# Altium footprint library PcbLib1.PcbLib: 42 footprints (part 1 of 3)
Each footprint in its own frame and in the unit in brackets; x right, y up, seen from the top. Pads: shape width x height; smd on the part's side, far side on the other; paste and mask are expansions set on the pad; w line width, h text height; cw(c..) or ccw(c..) is an arc to the next point about the centre after c.
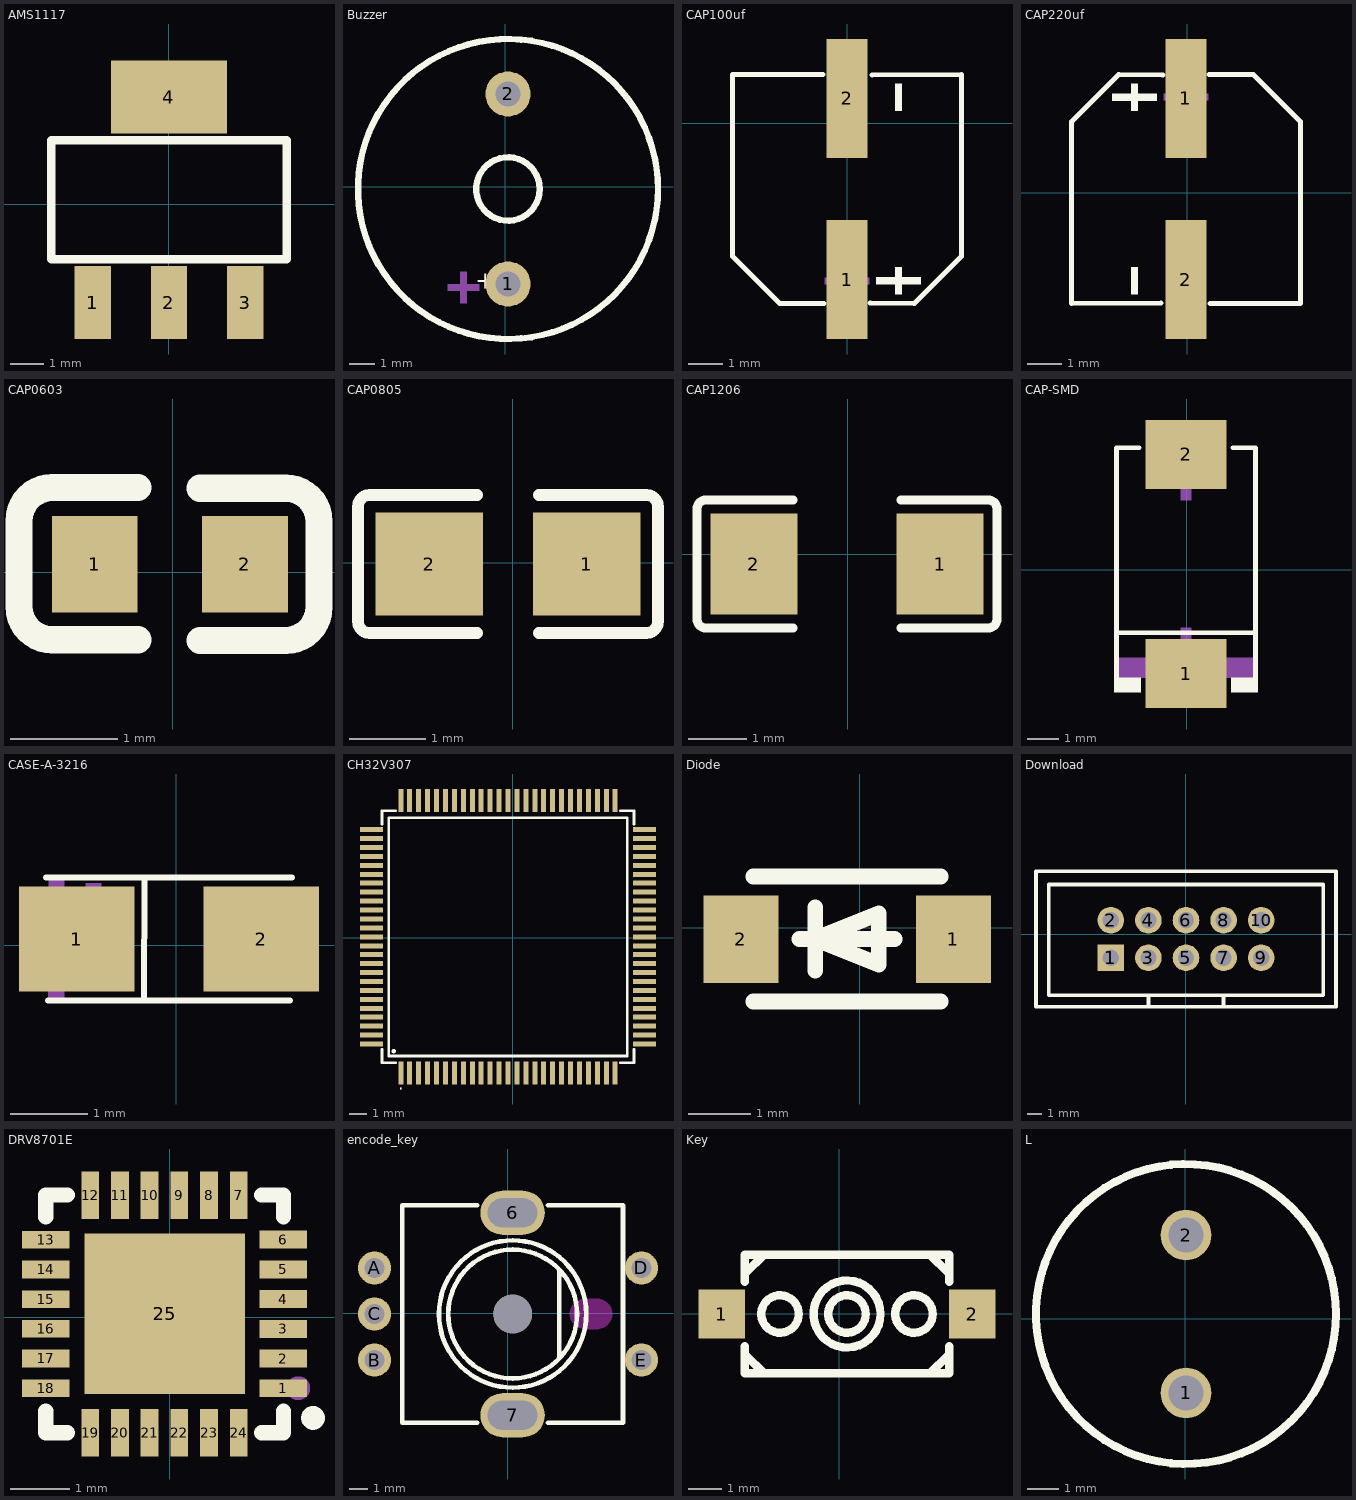
[diagram p0: the footprints below, top view; thin cyan lines are the x and y axes]

## AMS1117 [mm]
pads (4):
  rect 1.1x2.2 smd: 1(-2.297,-2.959) 2(0.003,-2.959) 3(2.303,-2.959)
  rect 3.5x2.2 smd: 4(0.003,3.238)
Top Overlay:
  lines w0.254: -3.547,-1.66 3.553,-1.66 3.553,1.94 -3.547,1.94 -3.547,-1.66
Mechanical 15:
  circle w0.254: c-2.283,-3.543 r0.127
3D body "AMS1117.step": height 1.75, standoff 0, extent -3.217,-3.433 3.283,3.677

## Buzzer [mm]
pads (2):
  round 1.8 hole 1: 1(0.102,-3.897) 2(0.102,3.703)
Top Overlay:
  circle w0.254: c0.102,-0.098 r1.27
  circle w0.254: c0.102,-0.098 r6
  text "+" at -1.215,-4.093 h0.71
Mechanical 15:
  region: -1.803,-4.542 -1.803,-3.399 -1.549,-3.399 -1.549,-4.669 -1.803,-4.669
  region: -1.168,-4.161 -2.311,-4.161 -2.311,-3.907 -1.041,-3.907 -1.041,-4.161
3D body "BUZZER1.step": height 9.51, standoff -4.5, extent -6.127,-5.893 5.873,6.107
3D body: height 0.25, standoff 0, extent -6.096,-5.334 -6.096,-5.334

## CAP100uf [mm]
pads (2):
  rect 1.2x3.5 smd: 1(-0.008,-4.608) 2(-0.008,0.732)
Top Overlay:
  region: 1.411,1.164 1.609,1.164 1.609,0.372 1.411,0.372
  region: 1.411,-5.04 1.609,-5.04 1.609,-4.248 1.411,-4.248
  region: 0.85,-4.743 2.17,-4.743 2.17,-4.545 0.85,-4.545
  lines w0.152: -0.715,1.432 -3.384,1.439 -3.384,-3.918 -1.988,-5.314 -0.693,-5.314 ; 0.678,-5.3 1.974,-5.313 3.368,-3.919 3.368,1.438 0.732,1.418
Mechanical 15:
  region: -0.107,1.164 0.091,1.164 0.091,0.372 -0.107,0.372
  region: -0.107,-5.04 0.091,-5.04 0.091,-4.248 -0.107,-4.248
  region: -0.668,-4.748 0.652,-4.748 0.652,-4.55 -0.668,-4.55
3D body "110uf.step": height 7.75, standoff 0, extent -3.295,-5.875 3.306,1.925

## CAP220uf [mm]
pads (2):
  rect 1.2x3.5 smd: 1(-0.033,2.779) 2(-0.033,-2.561)
Top Overlay:
  region: -1.452,-2.993 -1.65,-2.993 -1.65,-2.201 -1.452,-2.201
  region: -1.452,3.211 -1.65,3.211 -1.65,2.419 -1.452,2.419
  region: -0.891,2.914 -2.211,2.914 -2.211,2.716 -0.891,2.716
  lines w0.152: -0.772,-3.247 -3.409,-3.267 -3.409,2.09 -2.014,3.485 -0.719,3.471 ; 0.653,3.485 1.947,3.485 3.343,2.089 3.343,-3.267 0.675,-3.26
Mechanical 15:
  region: 0.066,-2.993 -0.132,-2.993 -0.132,-2.201 0.066,-2.201
  region: 0.066,3.211 -0.132,3.211 -0.132,2.419 0.066,2.419
  region: 0.627,2.919 -0.693,2.919 -0.693,2.721 0.627,2.721
3D body "220uf.step": height 7.75, standoff 0, extent -3.371,-3.704 3.23,4.096

## CAP0603 [mm]
pads (2):
  rect 0.8x0.9 smd: 1(-0.725,0.076) 2(0.675,0.076)
Top Overlay:
  lines w0.254: -0.321,-0.628 -1.121,-0.628 cw(c-1.121,-0.318) -1.431,-0.318 -1.431,0.482 cw(c-1.121,0.482) -1.121,0.792 -0.321,0.792 ; 0.255,-0.634 1.055,-0.634 ccw(c1.055,-0.324) 1.365,-0.324 ; 0.255,0.786 1.055,0.786 cw(c1.055,0.476) 1.365,0.476 ; 1.365,-0.324 1.365,0.476
3D body "C3.step": height 0.8, standoff 0, extent -0.927,-0.324 0.673,0.476

## CAP0805 [mm]
pads (2):
  rect 1.41x1.35 smd: 1(0.965,-0.015) 2(-1.095,-0.015)
Top Overlay:
  lines w0.152: -2.028,-0.766 ccw(c-1.876,-0.766) -1.876,-0.919 ; -2.028,-0.766 -2.028,0.736 cw(c-1.876,0.736) -1.876,0.888 -0.466,0.888 ; -1.876,-0.919 -0.466,-0.919 ; 0.336,-0.919 1.746,-0.919 ; 0.336,0.888 1.746,0.888 cw(c1.746,0.736) 1.899,0.736 1.899,-0.766 ; 1.746,-0.919 ccw(c1.746,-0.766) 1.899,-0.766
Top Paste:
  region: -0.54,0.605 -0.54,0.185 -0.985,0.185 -0.985,-0.265 -0.545,-0.265 -0.54,-0.675 -0.59,-0.725 -1.74,-0.725 -1.79,-0.675 -1.79,0.605 -1.74,0.655 -0.59,0.655
  region: 1.61,0.605 1.61,-0.675 1.56,-0.725 0.41,-0.725 0.36,-0.675 0.355,-0.265 0.805,-0.265 0.805,0.185 0.365,0.185 0.36,0.605 0.41,0.655 1.56,0.655
3D body "CAP0805.step": height 1.3, standoff 0, extent -1.145,-0.685 0.855,0.615

## CAP1206 [mm]
pads (2):
  rect 1.485x1.728 smd: 1(1.583,-0.168) 2(-1.602,-0.168)
Top Overlay:
  lines w0.152: -0.936,-1.26 -2.421,-1.26 cw(c-2.421,-1.108) -2.574,-1.108 -2.574,0.773 cw(c-2.421,0.773) -2.421,0.925 -0.936,0.925 ; 0.916,-1.26 2.401,-1.26 ccw(c2.401,-1.108) 2.554,-1.108 2.554,0.773 ccw(c2.401,0.773) 2.401,0.925 0.916,0.925
Top Paste:
  region: -0.86,0.596 -0.86,0.226 -0.96,0.126 -1.265,0.126 -1.365,0.026 -1.365,-0.361 -1.265,-0.461 -0.96,-0.461 -0.86,-0.561 -0.86,-0.932 -0.96,-1.032 -2.245,-1.032 -2.345,-0.932 -2.345,0.596 -2.245,0.696 -0.96,0.696
  region: 0.84,0.596 0.84,0.226 0.94,0.126 1.245,0.126 1.345,0.026 1.345,-0.361 1.245,-0.461 0.94,-0.461 0.84,-0.561 0.84,-0.932 0.94,-1.032 2.225,-1.032 2.325,-0.932 2.325,0.596 2.225,0.696 0.94,0.696
3D body "CAP1206.step": height 1.3, standoff 0, extent -1.679,-0.96 1.521,0.64

## CAP-SMD [mil]
pads (2):
  rect 102.05x86.91 smd: 1(-1.2,-130.94) 2(-1.2,145.54)
Top Overlay:
  region: 89.45,-136.4 55.82,-136.4 55.82,-154.4 89.45,-154.4
  region: -91.85,-136.4 -58.22,-136.4 -58.22,-154.4 -91.85,-154.4
  lines w6: -88.85,-139.4 -88.85,154 -60.22,154 ; -88.85,-79.48 86.45,-79.48 ; 57.82,154 86.45,154 86.45,-139.4
Mechanical 15:
  region: -7.55,138.3 5.15,138.3 5.15,87.52 -7.55,87.52
  region: -7.55,-123.7 5.15,-123.7 5.15,-72.92 -7.55,-72.92
  region: -43.52,-104.66 41.12,-104.66 41.12,-91.96 -43.52,-91.96
  region: -85.85,-136.4 -43.52,-136.4 -43.52,-111.01 -85.85,-111.01
  region: 83.45,-136.4 41.12,-136.4 41.12,-111.01 83.45,-111.01
3D body "CAP_SMD.step": height 167.47, standoff 0, extent -85.74,-139.9 83.55,147.49

## CASE-A-3216 [mil]
pads (2):
  rect 59.05x53.5 smd: 1(-51.07,3.1) 2(43.42,3.1)
Top Overlay:
  lines w3.15: -66.83,34.6 59.17,34.6 ; -65.83,-28.4 58.17,-28.4 ; -16.56,-28.4 -16.41,34.6
Mechanical 15:
  region: 55.25,8.23 55.25,-0.03 22.18,-0.03 22.18,8.23
  region: -65.38,35.1 -57.38,35.1 -57.38,22.1 -65.38,22.1
  region: -57.5,-28.9 -65.5,-28.9 -65.5,-15.9 -57.5,-15.9
  region: -27.84,8.23 -27.84,-0.03 -60.91,-0.03 -60.91,8.23
  region: -46.38,31.6 -38.38,31.6 -38.38,-23.4 -46.38,-23.4
3D body "CASE-A-3216.step": height 66.93, standoff 0, extent -67.29,-30.49 58.7,32.5

## CH32V307 [mm] "TSQFP, 100-Leads, Body 14.00x14.00mm, Pitch 0.50mm, IPC Medium Density"
height 1.5
pads (100):
  rect 0.28x1.287 smd: 1(-6.263,-7.574) 2(-5.763,-7.574) 3(-5.263,-7.574) 4(-4.763,-7.574) 5(-4.263,-7.574) 6(-3.763,-7.574) 7(-3.263,-7.574) 8(-2.763,-7.574) 9(-2.263,-7.574) 10(-1.763,-7.574) 11(-1.263,-7.574) 12(-0.763,-7.574) 13(-0.263,-7.574) 14(0.237,-7.574) 15(0.737,-7.574) 16(1.237,-7.574) 17(1.737,-7.574) 18(2.237,-7.574) 19(2.737,-7.574) 20(3.237,-7.574) 21(3.737,-7.574) 22(4.237,-7.574) 23(4.737,-7.574) 24(5.237,-7.574) 25(5.737,-7.574) 51(5.737,7.683) 52(5.237,7.683) 53(4.737,7.683) 54(4.237,7.683) 55(3.737,7.683) 56(3.237,7.683) 57(2.737,7.683) 58(2.237,7.683) 59(1.737,7.683) 60(1.237,7.683) 61(0.737,7.683) 62(0.237,7.683) 63(-0.263,7.683) 64(-0.763,7.683) 65(-1.263,7.683) 66(-1.763,7.683) 67(-2.263,7.683) 68(-2.763,7.683) 69(-3.263,7.683) 70(-3.763,7.683) 71(-4.263,7.683) 72(-4.763,7.683) 73(-5.263,7.683) 74(-5.763,7.683) 75(-6.263,7.683)
  rect 1.287x0.28 smd: 26(7.365,-5.946) 27(7.365,-5.446) 28(7.365,-4.946) 29(7.365,-4.446) 30(7.365,-3.946) 31(7.365,-3.446) 32(7.365,-2.946) 33(7.365,-2.446) 34(7.365,-1.946) 35(7.365,-1.446) 36(7.365,-0.946) 37(7.365,-0.446) 38(7.365,0.054) 39(7.365,0.554) 40(7.365,1.054) 41(7.365,1.554) 42(7.365,2.054) 43(7.365,2.554) 44(7.365,3.054) 45(7.365,3.554) 46(7.365,4.054) 47(7.365,4.554) 48(7.365,5.054) 49(7.365,5.554) 50(7.365,6.054) 76(-7.892,6.054) 77(-7.892,5.554) 78(-7.892,5.054) 79(-7.892,4.554) 80(-7.892,4.054) 81(-7.892,3.554) 82(-7.892,3.054) 83(-7.892,2.554) 84(-7.892,2.054) 85(-7.892,1.554) 86(-7.892,1.054) 87(-7.892,0.554) 88(-7.892,0.054) 89(-7.892,-0.446) 90(-7.892,-0.946) 91(-7.892,-1.446) 92(-7.892,-1.946) 93(-7.892,-2.446) 94(-7.892,-2.946) 95(-7.892,-3.446) 96(-7.892,-3.946) 97(-7.892,-4.446) 98(-7.892,-4.946) 99(-7.892,-5.446) 100(-7.892,-5.946)
Top Overlay:
  circle w0.055: c-6.263,-8.433 r0.027
  circle w0.124: c-6.657,-6.34 r0.062
  lines w0.152: -7.314,-6.238 -7.314,-6.997 -6.556,-6.997 ; -7.314,6.347 -7.314,7.105 -6.556,7.105 ; 6.029,-6.997 6.788,-6.997 6.788,-6.238 ; 6.029,7.105 6.788,7.105 6.788,6.347 ; -6.933,-6.616 6.407,-6.616 6.407,6.724 -6.933,6.724 -6.933,-6.616
Mechanical 15:
  circle w0.055: c-6.263,-8.433 r0.027
3D body "TSQFP50P1600X1600X150-100N.step": height 1.5, standoff 0, extent -8.253,-7.953 7.747,8.047

## Diode [mm]
pads (2):
  rect 1.2x1.4 smd: 1(1.499,-0.177) 2(-1.901,-0.177)
Top Overlay:
  lines w0.254: -1.701,-1.177 1.299,-1.177 ; -1.701,0.823 1.299,0.823 ; -0.963,-0.177 0.561,-0.177 ; -0.709,-0.685 -0.709,0.331 ; -0.709,-0.177 0.307,-0.583 0.307,0.229 -0.709,-0.177
Mechanical 15:
  region: 1.964,-0.39 1.089,-0.39 1.089,-0.22 1.964,-0.22 1.964,-0.23
  region: 1.61,0.201 1.61,-0.674 1.441,-0.674 1.441,0.201 1.45,0.201
  region: -1.509,-0.318 -2.384,-0.318 -2.384,-0.149 -1.509,-0.149 -1.509,-0.158
3D body "D5.step": height 0.81, standoff -0.26, extent -1.952,-1.154 1.698,0.646

## Download [mm]
pads (10):
  rect 1.8x1.8 hole 1.1: 1(-5.08,-1.575)
  round 1.8 hole 1.1: 2(-5.08,0.965) 3(-2.54,-1.575) 4(-2.54,0.965) 5(0,-1.575) 6(0,0.965) 7(2.54,-1.575) 8(2.54,0.965) 9(5.08,-1.575) 10(5.08,0.965)
Top Overlay:
  lines w0.254: -10.14,-4.877 -10.14,4.267 10.14,4.267 10.14,-4.877 -10.14,-4.877 ; -9.271,-4.115 9.271,-4.115 9.271,3.378 -9.271,3.378 -9.271,-4.115 ; -2.54,-4.877 2.54,-4.877 2.54,-4.115 -2.54,-4.115 -2.54,-4.877
3D body "CN3.step": height 9.2, standoff -3.1, extent -9.832,-4.744 10.468,4.156

## DRV8701E [mm]
pads (25):
  rect 0.8x0.3 smd: 1(1.914,-1.193) 2(1.914,-0.694) 3(1.914,-0.194) 4(1.914,0.307) 5(1.914,0.807) 6(1.914,1.308) 13(-2.086,1.307) 14(-2.086,0.806) 15(-2.086,0.306) 16(-2.086,-0.194) 17(-2.086,-0.692) 18(-2.086,-1.193)
  rect 0.3x0.8 smd: 7(1.164,2.057) 8(0.664,2.057) 9(0.163,2.057) 10(-0.337,2.057) 11(-0.837,2.057) 12(-1.336,2.057) 19(-1.336,-1.944) 20(-0.836,-1.944) 21(-0.336,-1.944) 22(0.163,-1.944) 23(0.663,-1.944) 24(1.163,-1.944)
  rect 2.7x2.7 smd: 25(-0.084,0.058)
Top Overlay:
  circle w0.2: c2.414,-1.693 r0.1
  lines w0.254: -2.086,-1.574 -2.086,-1.943 -1.717,-1.943 ; -2.086,1.688 -2.086,2.057 -1.719,2.057 ; 1.544,-1.943 1.914,-1.943 1.914,-1.574 ; 1.545,2.057 1.914,2.057 1.914,1.689
Top Paste:
  region: 0.996,-1.022 -1.164,-1.022 -1.164,1.138 0.996,1.138
  region: -2.535,1.157 -1.636,1.157 -1.636,1.456 -2.535,1.456
  region: -2.535,0.656 -1.636,0.656 -1.636,0.956 -2.535,0.956
  region: -2.535,0.156 -1.636,0.156 -1.636,0.456 -2.535,0.456
  region: -2.535,-0.345 -1.636,-0.345 -1.636,-0.042 -2.535,-0.042
  region: -2.535,-0.842 -1.636,-0.842 -1.636,-0.543 -2.535,-0.543
  region: -2.535,-1.343 -1.636,-1.343 -1.636,-1.043 -2.535,-1.043
  region: -1.185,2.507 -1.487,2.507 -1.487,1.608 -1.185,1.608
  region: -1.186,-1.493 -1.486,-1.493 -1.486,-2.395 -1.186,-2.395
  region: -0.687,2.507 -0.987,2.507 -0.987,1.608 -0.687,1.608
  region: -0.686,-1.493 -0.985,-1.493 -0.985,-2.395 -0.686,-2.395
  region: -0.487,-2.395 -0.185,-2.395 -0.185,-1.493 -0.487,-1.493
  region: -0.187,2.507 -0.487,2.507 -0.487,1.608 -0.187,1.608
  region: 0.013,-2.395 0.313,-2.395 0.313,-1.493 0.013,-1.493
  region: 0.313,2.507 0.014,2.507 0.014,1.608 0.313,1.608
  region: 0.813,-1.493 0.513,-1.493 0.513,-2.395 0.813,-2.395
  region: 0.814,2.507 0.514,2.507 0.514,1.608 0.814,1.608
  region: 1.313,-1.493 1.014,-1.493 1.014,-2.395 1.313,-2.395
  region: 1.314,2.507 1.014,2.507 1.014,1.608 1.314,1.608
  region: 2.364,-1.043 1.464,-1.043 1.464,-1.343 2.364,-1.343
  region: 2.364,1.457 1.465,1.457 1.465,1.158 2.364,1.158
  region: 1.465,0.657 2.364,0.657 2.364,0.957 1.465,0.957
  region: 1.465,0.157 2.364,0.157 2.364,0.457 1.465,0.457
  region: 2.364,-0.544 1.465,-0.544 1.465,-0.844 2.364,-0.844
  region: 1.465,-0.344 2.364,-0.344 2.364,-0.044 1.465,-0.044
Mechanical 15:
  circle w0.2: c2.165,-1.193 r0.1
3D body "U7.step": height 1.02, standoff 0, extent -2.01,-2.073 2.01,1.947

## encode_key [mm] "编码器开关"
pads (8):
  oval 3.5x2.4 hole 1.6 slot 2.7 at 0 deg: 6(0.253,5.449) 7(0.253,-5.551)
  round 1.8 hole 1.1: A(-7.247,2.449) B(-7.247,-2.551) C(-7.247,-0.051) D(7.253,2.449) E(7.253,-2.551)
  round 2.1 hole 2.1 unplated: ""(0.253,-0.051)
Top Overlay:
  circle w0.254: c0.253,-0.051 r4
  circle w0.254: c0.253,-0.051 r3.5
  lines w0.254: -5.747,5.849 -5.747,-5.951 -1.671,-5.951 ; -5.677,5.849 -1.671,5.849 ; 2.177,-5.951 6.253,-5.951 6.253,5.849 2.177,5.849 ; 2.793,-2.371 2.793,2.359
Keep-Out Layer:
  board cut-out: 4.133,0.779 4.895,0.779 4.998,0.771 5.194,0.704 5.368,0.591 5.508,0.439 5.606,0.258 5.657,0.057 5.657,-0.15 5.606,-0.35 5.508,-0.532 5.368,-0.684 5.194,-0.797 4.998,-0.864 4.895,-0.872 4.133,-0.872 4.03,-0.864 3.834,-0.797 3.661,-0.684 3.521,-0.532 3.422,-0.35 3.371,-0.15 3.371,0.057 3.422,0.258 3.521,0.439 3.661,0.591 3.834,0.704 4.03,0.771
3D body "SW5.step": height 21.49, standoff -3.51, extent -7.514,-6.865 7.386,5.976
3D body: height 0.25, standoff 0, extent 0,-0.508 0.254,-0.127

## Key [mm]
pads (2):
  rect 1.4x1.5 smd: 1(-3.571,0) 2(4.029,0)
Top Overlay:
  circle w0.254: c0.229,0 r0.568
  circle w0.254: c0.229,0 r1.016
  circle w0.254: c2.261,0 r0.568
  circle w0.254: c-1.803,0 r0.568
  lines w0.254: -2.871,-0.981 -2.871,-1.8 3.329,-1.8 3.329,-0.981 ; -2.871,0.981 -2.871,1.8 3.329,1.8 3.329,0.981 ; -2.819,-1.27 -2.311,-1.778 ; -2.819,1.27 -2.311,1.778 ; 2.769,-1.778 3.277,-1.27 ; 2.769,1.778 3.277,1.27
3D body "SW3.step": height 2.6, standoff 0, extent -3.632,-1.927 4.268,1.674
3D body: height 0.25, standoff 0, extent -4.445,-1.778 -4.445,-1.778

## L [mm]
pads (2):
  round 1.6 hole 1.1: 1(0.02,-2.355) 2(0.02,2.645)
Top Overlay:
  circle w0.254: c0.02,0.145 r4.75
3D body "L.step": height 12.5, standoff -5, extent -4.704,-4.613 4.806,4.887